# Altium footprint library Lib_001.PcbLib: 429 footprints (part 15 of 28)
Each footprint in its own frame and in the unit in brackets; x right, y up, seen from the top. Pads: shape width x height; smd on the part's side, far side on the other; paste and mask are expansions set on the pad; w line width, h text height; cw(c..) or ccw(c..) is an arc to the next point about the centre after c.
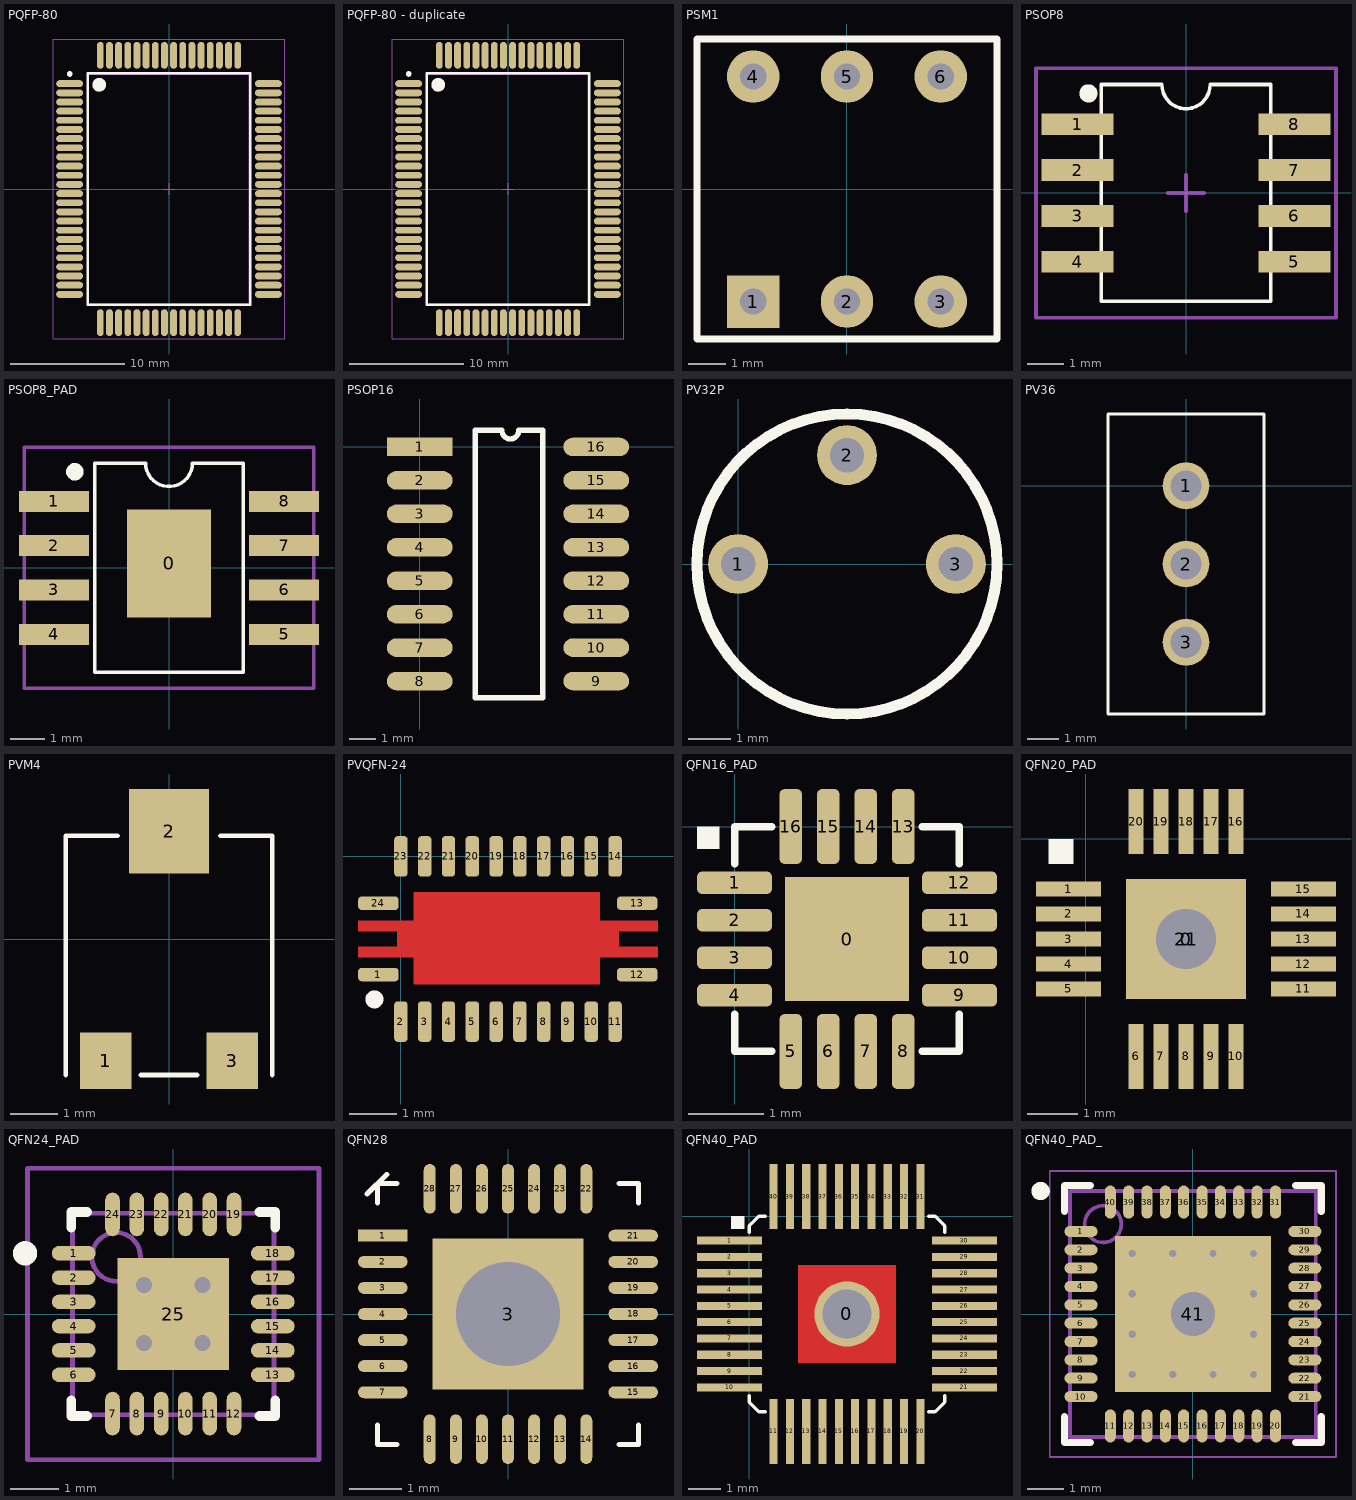
[diagram p14: the footprints below, top view; thin cyan lines are the x and y axes]

## PQFP-80 [mm] "80-Pin Quad Flat Pack Rectangular 0.8 mm Pitch, IPC Medium Density"
height 2.3
pads (80):
  oval 2.35x0.6 smd: 1(-8.675,9.2) 2(-8.675,8.4) 3(-8.675,7.6) 4(-8.675,6.8) 5(-8.675,6) 6(-8.675,5.2) 7(-8.675,4.4) 8(-8.675,3.6) 9(-8.675,2.8) 10(-8.675,2) 11(-8.675,1.2) 12(-8.675,0.4) 13(-8.675,-0.4) 14(-8.675,-1.2) 15(-8.675,-2) 16(-8.675,-2.8) 17(-8.675,-3.6) 18(-8.675,-4.4) 19(-8.675,-5.2) 20(-8.675,-6) 21(-8.675,-6.8) 22(-8.675,-7.6) 23(-8.675,-8.4) 24(-8.675,-9.2) 41(8.675,-9.2) 42(8.675,-8.4) 43(8.675,-7.6) 44(8.675,-6.8) 45(8.675,-6) 46(8.675,-5.2) 47(8.675,-4.4) 48(8.675,-3.6) 49(8.675,-2.8) 50(8.675,-2) 51(8.675,-1.2) 52(8.675,-0.4) 53(8.675,0.4) 54(8.675,1.2) 55(8.675,2) 56(8.675,2.8) 57(8.675,3.6) 58(8.675,4.4) 59(8.675,5.2) 60(8.675,6) 61(8.675,6.8) 62(8.675,7.6) 63(8.675,8.4) 64(8.675,9.2)
  oval 0.6x2.35 smd: 25(-6,-11.675) 26(-5.2,-11.675) 27(-4.4,-11.675) 28(-3.6,-11.675) 29(-2.8,-11.675) 30(-2,-11.675) 31(-1.2,-11.675) 32(-0.4,-11.675) 33(0.4,-11.675) 34(1.2,-11.675) 35(2,-11.675) 36(2.8,-11.675) 37(3.6,-11.675) 38(4.4,-11.675) 39(5.2,-11.675) 40(6,-11.675) 65(6,11.675) 66(5.2,11.675) 67(4.4,11.675) 68(3.6,11.675) 69(2.8,11.675) 70(2,11.675) 71(1.2,11.675) 72(0.4,11.675) 73(-0.4,11.675) 74(-1.2,11.675) 75(-2,11.675) 76(-2.8,11.675) 77(-3.6,11.675) 78(-4.4,11.675) 79(-5.2,11.675) 80(-6,11.675)
Top Overlay:
  circle w0.6: c-6.1,9.1 r0.3
  circle w0.25: c-8.675,10.05 r0.125
  lines w0.2: -7.1,-10.1 7.1,-10.1 7.1,10.1 -7.1,10.1 -7.1,-10.1
Mechanical 13:
  circle w0.1: c-6.1,9.1 r0.5
  lines w0.1: -7,-10 7,-10 7,10 -7,10 -7,-10
Mechanical 15:
  lines w0.1: -0.5,0 0.5,0 ; 0,-0.5 0,0.5 ; -10.1,-13.1 10.1,-13.1 10.1,13.1 -10.1,13.1 -10.1,-13.1
3D body "1.step": height 3.4, standoff 0, extent -7,-10 7,10

## PQFP-80 - duplicate [mm] "80-Pin Quad Flat Pack Rectangular 0.8 mm Pitch, IPC Medium Density"
height 2.3
pads (80):
  oval 2.35x0.6 smd: 1(-8.675,9.2) 2(-8.675,8.4) 3(-8.675,7.6) 4(-8.675,6.8) 5(-8.675,6) 6(-8.675,5.2) 7(-8.675,4.4) 8(-8.675,3.6) 9(-8.675,2.8) 10(-8.675,2) 11(-8.675,1.2) 12(-8.675,0.4) 13(-8.675,-0.4) 14(-8.675,-1.2) 15(-8.675,-2) 16(-8.675,-2.8) 17(-8.675,-3.6) 18(-8.675,-4.4) 19(-8.675,-5.2) 20(-8.675,-6) 21(-8.675,-6.8) 22(-8.675,-7.6) 23(-8.675,-8.4) 24(-8.675,-9.2) 41(8.675,-9.2) 42(8.675,-8.4) 43(8.675,-7.6) 44(8.675,-6.8) 45(8.675,-6) 46(8.675,-5.2) 47(8.675,-4.4) 48(8.675,-3.6) 49(8.675,-2.8) 50(8.675,-2) 51(8.675,-1.2) 52(8.675,-0.4) 53(8.675,0.4) 54(8.675,1.2) 55(8.675,2) 56(8.675,2.8) 57(8.675,3.6) 58(8.675,4.4) 59(8.675,5.2) 60(8.675,6) 61(8.675,6.8) 62(8.675,7.6) 63(8.675,8.4) 64(8.675,9.2)
  oval 0.6x2.35 smd: 25(-6,-11.675) 26(-5.2,-11.675) 27(-4.4,-11.675) 28(-3.6,-11.675) 29(-2.8,-11.675) 30(-2,-11.675) 31(-1.2,-11.675) 32(-0.4,-11.675) 33(0.4,-11.675) 34(1.2,-11.675) 35(2,-11.675) 36(2.8,-11.675) 37(3.6,-11.675) 38(4.4,-11.675) 39(5.2,-11.675) 40(6,-11.675) 65(6,11.675) 66(5.2,11.675) 67(4.4,11.675) 68(3.6,11.675) 69(2.8,11.675) 70(2,11.675) 71(1.2,11.675) 72(0.4,11.675) 73(-0.4,11.675) 74(-1.2,11.675) 75(-2,11.675) 76(-2.8,11.675) 77(-3.6,11.675) 78(-4.4,11.675) 79(-5.2,11.675) 80(-6,11.675)
Top Overlay:
  circle w0.6: c-6.1,9.1 r0.3
  circle w0.25: c-8.675,10.05 r0.125
  lines w0.2: -7.1,-10.1 7.1,-10.1 7.1,10.1 -7.1,10.1 -7.1,-10.1
Mechanical 13:
  circle w0.1: c-6.1,9.1 r0.5
  lines w0.1: -7,-10 7,-10 7,10 -7,10 -7,-10
Mechanical 15:
  lines w0.1: -0.5,0 0.5,0 ; 0,-0.5 0,0.5 ; -10.1,-13.1 10.1,-13.1 10.1,13.1 -10.1,13.1 -10.1,-13.1
3D body "1.step": height 3.4, standoff 0, extent -7,-10 7,10
3D body "2.step": height 1.85, standoff 0, extent -8.953,-11.951 8.953,11.951

## PSM1 [mm]
height 8
pads (6):
  rect 1.4x1.4 hole 0.7: 1(-2.5,-3)
  round 1.4 hole 0.7: 2(0,-3) 3(2.5,-3) 4(-2.5,3) 5(0,3) 6(2.5,3)
Top Overlay:
  lines w0.2: -4,-4 4,-4 4,4 -4,4 -4,-4
3D body "User Library-PSM1-0-0.step": height 13.5, standoff -3.5, extent -4,-4 4,4

## PSOP8 [mm] "SOP, 8-Leads, Body 6x4.7mm, Pitch 1.27mm, IPC Medium Density"
height 1.5
pads (8):
  rect 2x0.6 smd: 1(-3,1.905) 2(-3,0.635) 3(-3,-0.635) 4(-3,-1.905) 5(3,-1.905) 6(3,-0.635) 7(3,0.635) 8(3,1.905)
Top Overlay:
  circle w0.25: c-2.7,2.755 r0.125
  lines w0.1: -2.35,-3 -2.35,3 -0.67,3 ccw(c0,3) 0.67,3 2.35,3 2.35,-3 -2.35,-3
Mechanical 15:
  lines w0.1: -0.5,0 0.5,0 ; 0,-0.5 0,0.5 ; -4.15,-3.45 -4.15,3.45 4.15,3.45 4.15,-3.45 -4.15,-3.45
3D body "SOP8.STEP": height 1.75, standoff 0, extent -3.1,-2.905 3.1,2.905

## PSOP8_PAD [mm] "SOP, 8-Leads, Body 6x4.7mm, Pitch 1.27mm, IPC Medium Density"
height 1.5
pads (9):
  rect 2.41x3.1 smd: 0(0,0.127)
  rect 2x0.6 smd: 1(-3.3,1.905) 2(-3.3,0.635) 3(-3.3,-0.635) 4(-3.3,-1.905) 5(3.3,-1.905) 6(3.3,-0.635) 7(3.3,0.635) 8(3.3,1.905)
Top Overlay:
  circle w0.25: c-2.7,2.755 r0.125
  lines w0.1: -2.125,-3 -2.125,3 -0.67,3 ccw(c0,3) 0.67,3 2.125,3 2.125,-3 -2.125,-3
Mechanical 15:
  lines w0.1: -0.5,0 0.5,0 ; 0,-0.5 0,0.5 ; -4.15,-3.45 -4.15,3.45 4.15,3.45 4.15,-3.45 -4.15,-3.45
3D body "SOP8.STEP": height 1.75, standoff 0, extent -3.1,-2.905 3.1,2.905

## PSOP16 [mm]
pads (16):
  rect 2.5x0.7 smd: 1(0,0)
  oval 2.5x0.7 smd: 2(0,-1.27) 3(0,-2.54) 4(0,-3.81) 5(0,-5.08) 6(0,-6.35) 7(0,-7.62) 8(0,-8.89) 9(6.7,-8.89) 10(6.7,-7.62) 11(6.7,-6.35) 12(6.7,-5.08) 13(6.7,-3.81) 14(6.7,-2.54) 15(6.7,-1.27) 16(6.7,0)
Top Overlay:
  lines w0.2: 3.12,0.62 ccw(c3.437,0.62) 3.755,0.62 ; 3.12,0.635 2.11,0.635 2.11,-9.525 4.67,-9.525 4.67,0.635 3.755,0.635
3D body "User Library-SOP16_208mil (5_3mm).STEP": height 2, standoff 0, extent -0.67,-9.53 7.251,0.67

## PV32P [mm] "Trimmer Potentiometers"
pads (3):
  round 1.4 hole 0.8: 1(0,0) 2(2.54,2.54) 3(5.08,0)
Top Overlay:
  circle w0.254: c2.54,0 r3.5
3D body: height 5.8, standoff 0, extent -0.882,-3.442 6.09,3.544

## PV36 [mm]
height 6.5
pads (3):
  round 1.5 hole 1: 1(0,0) 2(0,-2.5) 3(0,-5)
Top Overlay:
  lines w0.1: -2.5,-7.3 2.5,-7.3 2.5,2.3 -2.5,2.3 -2.5,-7.3
3D body: height 0.5, standoff -2.5, extent -0.248,-5.249 0.25,-4.75
3D body: height 0.5, standoff -2.5, extent -0.248,-2.749 0.25,-2.25
3D body: height 0.5, standoff -2.5, extent -0.248,-0.249 0.25,0.25
3D body: height 10, standoff 0, extent -2.5,-7.3 2.5,2.3
3D body: height 11.4, standoff 10, extent 0.408,0.202 2.4,2.198

## PVM4 [mm]
pads (3):
  rect 1.1x1.2 smd: 1(-1.35,-2.6) 3(1.35,-2.6)
  rect 1.7x1.8 smd: 2(0,2.3)
Top Overlay:
  lines w0.1: -2.2,-2.9 -2.2,2.2 -1.1,2.2 ; -0.6,-2.9 0.6,-2.9 ; 1.1,2.2 2.2,2.2 2.2,-2.9
3D body "PVM4.STEP": height 2, standoff 0, extent -2,-2.4 2,2.3

## PVQFN-24 [mm] "SN74LVC8T245RHLR"
pads (24):
  rrect50% 0.85x0.28 smd mask+0.07: 1(-0.473,-2.483) 12(4.965,-2.483) 13(4.965,-0.983) 24(-0.473,-0.983)
  rrect50% 0.28x0.85 smd mask+0.07: 2(0,-3.47) 3(0.5,-3.47) 4(1,-3.47) 5(1.5,-3.47) 6(2,-3.47) 7(2.5,-3.47) 8(3,-3.47) 9(3.5,-3.47) 10(4,-3.47) 11(4.5,-3.47) 14(4.5,0) 15(4,0) 16(3.5,0) 17(3,0) 18(2.5,0) 19(2,0) 20(1.5,0) 21(1,0) 22(0.5,0) 23(0,0)
Top Layer:
  region: 5.402,-1.346 3.811,-1.346 3.811,-1.576 5.402,-1.576
  region: 5.402,-1.896 3.811,-1.896 3.811,-2.126 5.402,-2.126
  region: 4.579,-1.461 4.117,-1.461 4.117,-2.01 4.579,-2.01
  rectangle: -0.079,-2.01 0.383,-1.461
  rectangle: -0.902,-2.126 0.689,-1.896
  rectangle: -0.902,-1.576 0.689,-1.346
  rectangle: 0.264,-2.695 4.181,-0.747
Top Overlay:
  lines w0.254: -0.497,-3.018 cw(c-0.557,-3.003) -0.495,-2.998
3D body "User Library-PVQFN-N24.step": height 1, standoff 0, extent -0.585,-3.561 5.085,0.091

## QFN16_PAD [mm] "Quad Flat Package 16 pins with Exposed Pad"
height 1
pads (17):
  rect 1.65x1.65 smd: 0(1.5,-1.5)
  rrect50% 1x0.3 smd: 1(0,-0.75) 2(0,-1.25) 3(0,-1.75) 4(0,-2.25) 9(3,-2.25) 10(3,-1.75) 11(3,-1.25) 12(3,-0.75)
  rrect50% 0.3x1 smd: 5(0.75,-3) 6(1.25,-3) 7(1.75,-3) 8(2.25,-3) 13(2.25,0) 14(1.75,0) 15(1.25,0) 16(0.75,0)
Top Overlay:
  rectangle: -0.5,-0.3 -0.2,0
  lines w0.1: 0,-2.5 0,-3 0.5,-3 ; 0,-0.5 0,0 0.5,0 ; 2.5,-3 3,-3 3,-2.5 ; 2.5,0 3,0 3,-0.5
3D body "User Library-qfn16-3x3.step": height 0.92, standoff 0, extent -0.02,-2.98 2.98,0.02

## QFN20_PAD [mm]
height 0.8
pads (22):
  round 2 hole 1.2: 0(2,-2)
  rect 1.3x0.3 smd: 1(-0.35,-1) 2(-0.35,-1.5) 3(-0.35,-2) 4(-0.35,-2.5) 5(-0.35,-3) 11(4.35,-3) 12(4.35,-2.5) 13(4.35,-2) 14(4.35,-1.5) 15(4.35,-1)
  rect 0.3x1.3 smd: 6(1,-4.35) 7(1.5,-4.35) 8(2,-4.35) 9(2.5,-4.35) 10(3,-4.35) 16(3,0.35) 17(2.5,0.35) 18(2,0.35) 19(1.5,0.35) 20(1,0.35)
  rect 2.4x2.4 smd: 21(2,-2)
Top Overlay:
  rectangle: -0.75,-0.5 -0.25,0
3D body: height 0.8, standoff 0, extent 0,-4 4,0

## QFN24_PAD [mm] "24-Pin Quad Flat No-Lead 0.5 mm Pitch, IPC Low Density"
height 1
pads (25):
  oval 0.9x0.3 smd: 1(-2.05,1.25) 2(-2.05,0.75) 3(-2.05,0.25) 4(-2.05,-0.25) 5(-2.05,-0.75) 6(-2.05,-1.25) 13(2.05,-1.25) 14(2.05,-0.75) 15(2.05,-0.25) 16(2.05,0.25) 17(2.05,0.75) 18(2.05,1.25)
  oval 0.3x0.9 smd: 7(-1.25,-2.05) 8(-0.75,-2.05) 9(-0.25,-2.05) 10(0.25,-2.05) 11(0.75,-2.05) 12(1.25,-2.05) 19(1.25,2.05) 20(0.75,2.05) 21(0.25,2.05) 22(-0.25,2.05) 23(-0.75,2.05) 24(-1.25,2.05)
  rect 2.3x2.3 smd: 25(0,0)
via 0.6,-0.6 diameter 0.66 hole 0.33
via -0.6,-0.6 diameter 0.66 hole 0.33
via 0.6,0.6 diameter 0.66 hole 0.33
via -0.6,0.6 diameter 0.66 hole 0.33
Top Overlay:
  circle w0.25: c-3.05,1.25 r0.125
  lines w0.2: -2.1,-1.775 -2.1,-2.1 -1.775,-2.1 ; -2.1,1.775 -2.1,2.1 -1.775,2.1 ; 1.775,-2.1 2.1,-2.1 2.1,-1.775 ; 1.775,2.1 2.1,2.1 2.1,1.775
Mechanical 13:
  circle w0.1: c-1.175,1.175 r0.5
  lines w0.1: -2.075,-2.075 2.075,-2.075 2.075,2.075 -2.075,2.075 -2.075,-2.075
Mechanical 15:
  lines w0.1: -0.5,0 0.5,0 ; 0,-0.5 0,0.5 ; -3,-3 3,-3 3,3 -3,3 -3,-3
3D body "User Library-QFN24 Punch.step": height 0.65, standoff -0.02, extent -2,-2 2,2

## QFN28 [mm]
pads (30):
  rect 0.95x0.23 smd: 1(-2.4,1.5)
  oval 0.95x0.23 smd: 2(-2.4,1) 3(-2.4,0.5) 4(-2.4,0) 5(-2.4,-0.5) 6(-2.4,-1) 7(-2.4,-1.5) 15(2.4,-1.5) 16(2.4,-1) 17(2.4,-0.5) 18(2.4,0) 19(2.4,0.5) 20(2.4,1) 21(2.4,1.5)
  rect 2.9x2.9 smd: 3(0,0)
  rect 0.1x0.1 hole 2: 3(0,0)
  oval 0.23x0.95 smd: 8(-1.5,-2.4) 9(-1,-2.4) 10(-0.5,-2.4) 11(0,-2.4) 12(0.5,-2.4) 13(1,-2.4) 14(1.5,-2.4) 22(1.5,2.4) 23(1,2.4) 24(0.5,2.4) 25(0,2.4) 26(-0.5,2.4) 27(-1,2.4) 28(-1.5,2.4)
Top Overlay:
  lines w0.1: -2.7,2.3 -2.325,2.675 ; -2.5,-2.125 -2.5,-2.5 -2.125,-2.5 ; -2.5,2.125 -2.5,2.5 -2.125,2.5 ; 2.125,-2.5 2.5,-2.5 2.5,-2.125 ; 2.125,2.5 2.5,2.5 2.5,2.125
3D body: height 0.9, standoff 0, extent -2.5,-2.5 2.5,2.5

## QFN40_PAD [mm] "QFN 40 leads with Exposed Pad"
height 1
pads (41):
  round 2 hole 1.5: 0(3,-3)
  rect 2x0.25 smd: 1(-0.6,-0.75) 2(-0.6,-1.25) 3(-0.6,-1.75) 4(-0.6,-2.25) 5(-0.6,-2.75) 6(-0.6,-3.25) 7(-0.6,-3.75) 8(-0.6,-4.25) 9(-0.6,-4.75) 10(-0.6,-5.25) 21(6.6,-5.25) 22(6.6,-4.75) 23(6.6,-4.25) 24(6.6,-3.75) 25(6.6,-3.25) 26(6.6,-2.75) 27(6.6,-2.25) 28(6.6,-1.75) 29(6.6,-1.25) 30(6.6,-0.75)
  rect 0.25x2 smd: 11(0.75,-6.6) 12(1.25,-6.6) 13(1.75,-6.6) 14(2.25,-6.6) 15(2.75,-6.6) 16(3.25,-6.6) 17(3.75,-6.6) 18(4.25,-6.6) 19(4.75,-6.6) 20(5.25,-6.6) 31(5.25,0.6) 32(4.75,0.6) 33(4.25,0.6) 34(3.75,0.6) 35(3.25,0.6) 36(2.75,0.6) 37(2.25,0.6) 38(1.75,0.6) 39(1.25,0.6) 40(0.75,0.6)
Top Layer:
  rectangle: 1.5,-4.5 4.5,-1.5
Top Overlay:
  rectangle: -0.55,-0.4 -0.15,0
  lines w0.1: 0,-5.5 0,-5.7 0.3,-6 0.5,-6 ; 0,-0.5 0,-0.3 0.3,0 0.5,0 ; 5.5,-6 5.7,-6 6,-5.7 6,-5.5 ; 5.5,0 5.7,0 6,-0.3 6,-0.5
3D body: height 1, standoff 0, extent 0,-6 6,0

## QFN40_PAD_ [mm] "QFN, 40-Leads, Body 6,60x6,60mm, Pitch 0,50mm, Thermal Pad 4,25x4,25mm, IPC Medium Density"
height 0.8
pads (41):
  oval 0.9x0.3 smd: 1(-3.05,2.25) 2(-3.05,1.75) 3(-3.05,1.25) 4(-3.05,0.75) 5(-3.05,0.25) 6(-3.05,-0.25) 7(-3.05,-0.75) 8(-3.05,-1.25) 9(-3.05,-1.75) 10(-3.05,-2.25) 21(3.05,-2.25) 22(3.05,-1.75) 23(3.05,-1.25) 24(3.05,-0.75) 25(3.05,-0.25) 26(3.05,0.25) 27(3.05,0.75) 28(3.05,1.25) 29(3.05,1.75) 30(3.05,2.25)
  oval 0.3x0.9 smd: 11(-2.25,-3.05) 12(-1.75,-3.05) 13(-1.25,-3.05) 14(-0.75,-3.05) 15(-0.25,-3.05) 16(0.25,-3.05) 17(0.75,-3.05) 18(1.25,-3.05) 19(1.75,-3.05) 20(2.25,-3.05) 31(2.25,3.05) 32(1.75,3.05) 33(1.25,3.05) 34(0.75,3.05) 35(0.25,3.05) 36(-0.25,3.05) 37(-0.75,3.05) 38(-1.25,3.05) 39(-1.75,3.05) 40(-2.25,3.05)
  rect 4.25x4.25 smd: 41(0,0)
via 0,0 diameter 1.5 hole 1.2
via 1.65,-1.65 diameter 0.5 hole 0.2
via 0.55,-1.65 diameter 0.5 hole 0.2
via -0.55,-1.65 diameter 0.5 hole 0.2
via -1.65,-1.65 diameter 0.5 hole 0.2
via 1.65,-0.55 diameter 0.5 hole 0.2
via -1.65,-0.55 diameter 0.5 hole 0.2
via 1.65,0.55 diameter 0.5 hole 0.2
via -1.65,0.55 diameter 0.5 hole 0.2
via 1.65,1.65 diameter 0.5 hole 0.2
via 0.55,1.65 diameter 0.5 hole 0.2
via -0.55,1.65 diameter 0.5 hole 0.2
via -1.65,1.65 diameter 0.5 hole 0.2
Top Overlay:
  circle w0.25: c-4.15,3.35 r0.125
  lines w0.2: -3.5,-2.8 -3.5,-3.5 -2.8,-3.5 ; -3.5,2.8 -3.5,3.5 -2.8,3.5 ; 2.8,-3.5 3.5,-3.5 3.5,-2.8 ; 2.8,3.5 3.5,3.5 3.5,2.8
Mechanical 13:
  circle w0.1: c-2.45,2.45 r0.5
  lines w0.1: -3.35,-3.35 3.35,-3.35 3.35,3.35 -3.35,3.35 -3.35,-3.35
Mechanical 15:
  lines w0.05: -3.9,-3.9 3.9,-3.9 3.9,3.9 -3.9,3.9 -3.9,-3.9
  lines w0.1: -0.5,0 0.5,0 ; 0,-0.5 0,0.5
3D body "User Library-QFN40 (6x6).step": height 0.9, standoff 0, extent -3,-3 3,3